# Altium footprint library 元件2.PcbLib: 204 footprints (part 1 of 13)
Each footprint in its own frame and in the unit in brackets; x right, y up, seen from the top. Pads: shape width x height; smd on the part's side, far side on the other; paste and mask are expansions set on the pad; w line width, h text height; cw(c..) or ccw(c..) is an arc to the next point about the centre after c.
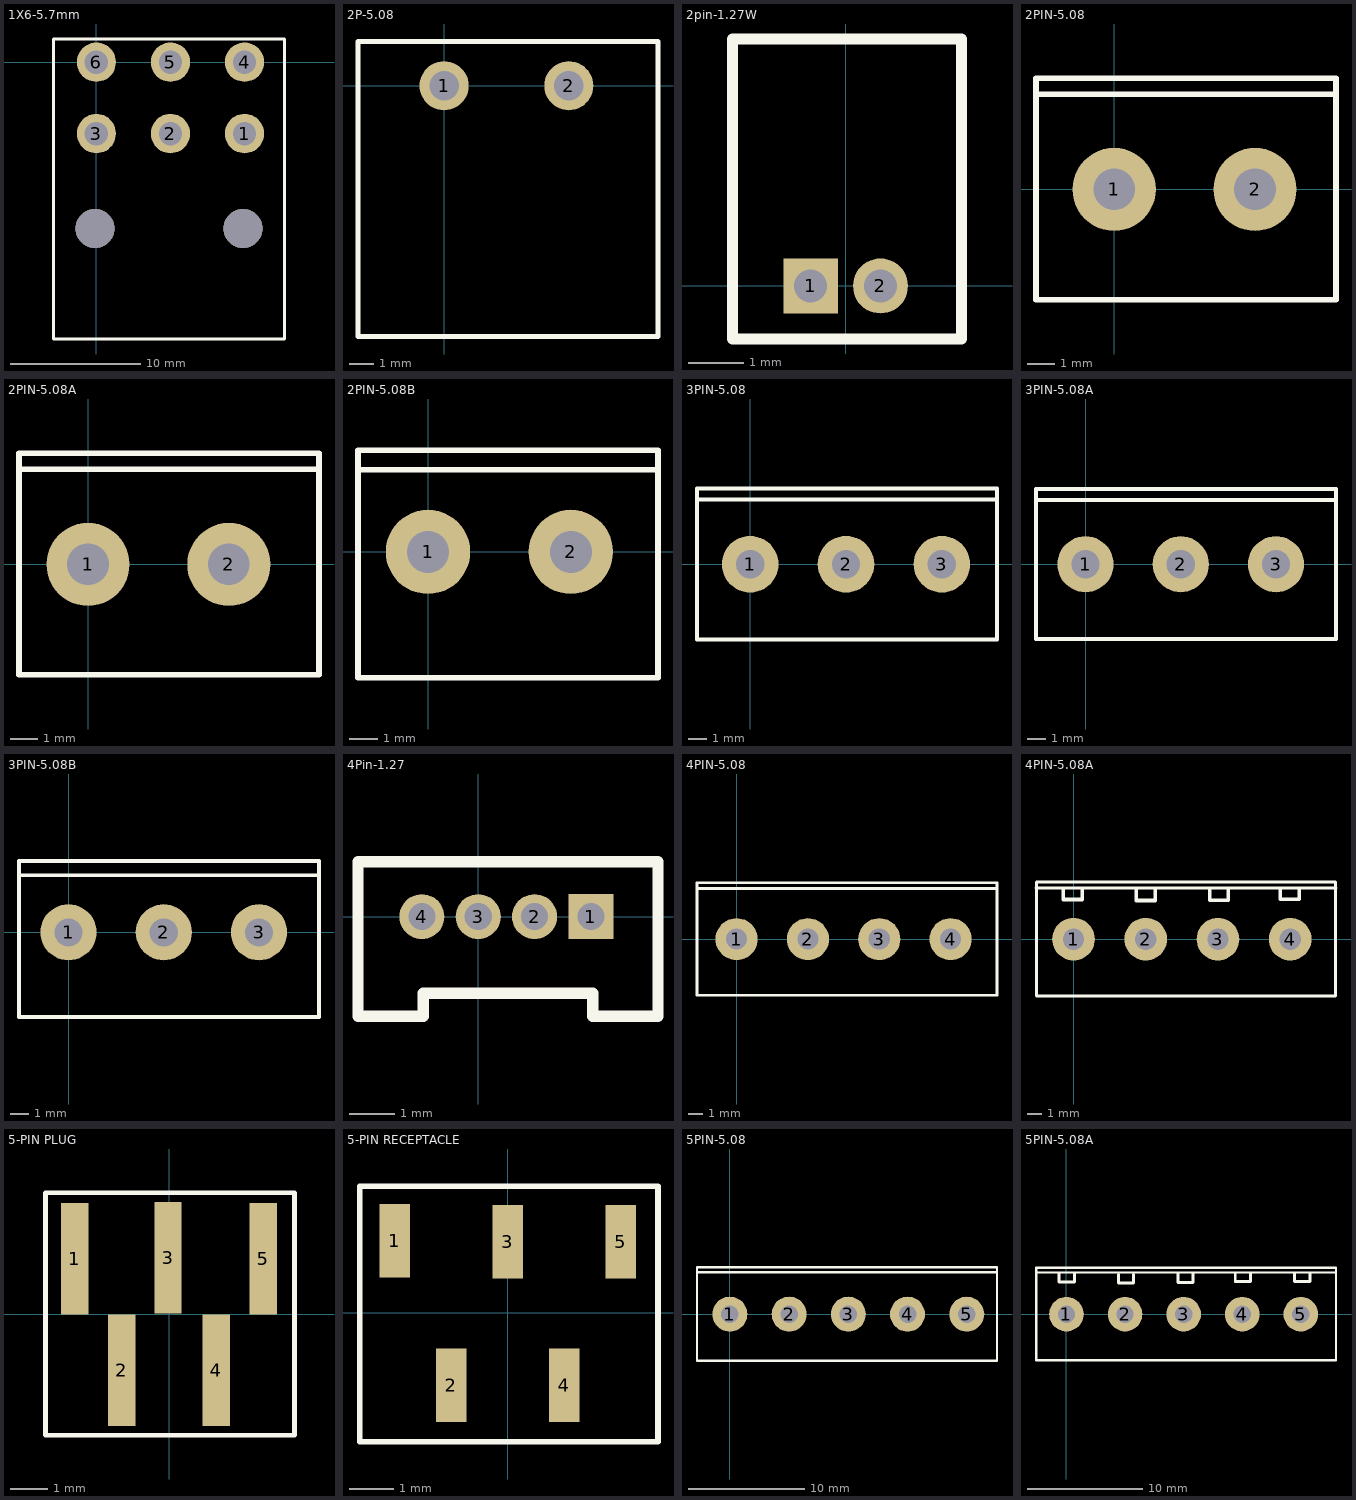
[diagram p0: the footprints below, top view; thin cyan lines are the x and y axes]

## 1X6-5.7mm [mm] "1X06"
pads (6):
  oval 3x3.048 hole 1.8: 1(11.4,-5.5) 2(5.7,-5.5) 3(0,-5.5) 4(11.4,0) 5(5.7,0) 6(0,0)
via 11.298,-12.8 diameter 3 hole 3
via -0.102,-12.802 diameter 3 hole 3
Top Overlay:
  lines w0.254: -3.302,-21.311 -3.302,1.778 14.478,1.778 14.478,-21.311 -3.302,-21.311
3D body "1720640006.stp": height 14.62, standoff -3.52, extent -3.226,-21.242 14.534,0.719

## 2P-5.08 [mm]
height 0.9
pads (2):
  round 2 hole 1.2: 1(0,0) 2(5.08,0)
Top Overlay:
  lines w0.2: -3.505,-10.211 8.712,-10.211 8.712,1.803 -3.505,1.803 -3.505,-10.211
3D body "14043.stp": height 8.6, standoff -3.5, extent -3.464,-10.109 8.696,1.893

## 2pin-1.27W [mm] "Molex PicoBlade 2-way housing, positive"
pads (2):
  rect 1x1 hole 0.6: 1(-0.635,0)
  round 1 hole 0.6: 2(0.635,0)
Top Overlay:
  lines w0.2: -2.057,-0.965 2.108,-0.965 2.108,4.496 -2.057,4.496 -2.057,-0.965
3D body "User Library-53048-0210.STEP": height 3.5, standoff -2.4, extent -2.108,-0.997 2.142,4.503

## 2PIN-5.08 [mm]
pads (2):
  round 3 hole 1.5: 1(0,0) 2(5.08,0)
Top Overlay:
  lines w0.2: -2.819,3.429 8.001,3.429 ; -2.819,-3.988 8.001,-3.988 8.001,4.013 -2.819,4.013 -2.819,-3.988
3D body "3970.stp": height 14.99, standoff -4.01, extent -1.525,-3.175 6.555,3.175

## 2PIN-5.08A [mm]
pads (2):
  round 3 hole 1.5: 1(0,0) 2(5.08,0)
Top Overlay:
  lines w0.2: -2.489,3.429 8.255,3.429 ; -2.489,-3.988 -2.489,4.013 8.331,4.013 8.331,-3.988 -2.489,-3.988
3D body "2-5.08 (2).stp": height 14.2, standoff -3.5, extent -2.54,-5.205 8.361,4.595

## 2PIN-5.08B [mm] "3A"
pads (2):
  round 3 hole 1.5: 1(0,0) 2(5.08,0)
Top Overlay:
  lines w0.2: -2.438,2.921 8.119,2.921 ; -2.489,-4.47 8.179,-4.47 8.179,3.607 -2.489,3.607 -2.489,-4.47
3D body "3A-2way.step": height 10, standoff -3, extent -2.481,-4.577 8.119,3.023

## 3PIN-5.08 [mm]
pads (3):
  round 3 hole 1.5: 1(0,0) 2(5.08,0) 3(10.16,0)
Top Overlay:
  lines w0.2: -2.819,3.429 13.081,3.429 ; -2.819,-3.988 -2.819,4.013 13.081,4.013 13.081,-3.988 -2.819,-3.988
3D body "3971.stp": height 14.99, standoff -4.01, extent -1.5,-3.15 11.66,3.2

## 3PIN-5.08A [mm] "3A"
pads (3):
  round 3 hole 1.5: 1(0,0) 2(5.08,0) 3(10.16,0)
Top Overlay:
  lines w0.2: -2.642,3.429 13.284,3.429 ; -2.642,-3.988 13.36,-3.988 13.36,4.013 -2.642,4.013 -2.642,-3.988
3D body "3-5.08.stp": height 14.2, standoff -3.5, extent -2.53,-5.207 13.452,4.593

## 3PIN-5.08B [mm]
pads (3):
  round 3 hole 1.5: 1(0,0) 2(5.08,0) 3(10.16,0)
Top Overlay:
  lines w0.2: -2.616,3.048 13.31,3.048 ; -2.642,-4.521 -2.642,3.81 13.36,3.81 13.36,-4.521 -2.642,-4.521
3D body "User Library-Terminal-Screw-3A-3way.step": height 10, standoff -3, extent -2.466,-4.623 13.134,2.977

## 4Pin-1.27 [mm]
pads (4):
  rect 1x1 hole 0.6: 1(2.5,0)
  round 1 hole 0.6: 2(1.25,0) 3(0,0) 4(-1.25,0)
Top Overlay:
  lines w0.254: -2.667,-2.21 -2.667,1.219 3.988,1.219 3.988,-2.21 2.54,-2.21 2.54,-1.702 -0.495,-1.702 -1.219,-1.702 -1.219,-2.21 -2.667,-2.21
3D body "31732.stp": height 4.37, standoff -2.23, extent -2.69,-2.206 3.96,1.194

## 4PIN-5.08 [mm]
pads (4):
  round 3 hole 1.5: 1(0,0) 2(5.08,0) 3(10.16,0) 4(15.24,0)
Top Overlay:
  lines w0.2: -2.819,3.607 18.542,3.607 ; -2.819,-3.988 18.542,-3.988 18.542,4.013 -2.819,4.013 -2.819,-3.988
3D body "3972.stp": height 14.99, standoff -4.01, extent -1.525,-3.2 16.715,3.149

## 4PIN-5.08A [mm]
pads (4):
  round 3 hole 1.5: 1(0,0) 2(5.08,0) 3(10.16,0) 4(15.24,0)
Top Overlay:
  lines w0.2: -2.642,3.607 18.466,3.607 ; -2.616,-3.988 -2.616,4.013 18.44,4.013 18.44,-3.988 -2.616,-3.988
  lines w0.254: -0.711,3.531 -0.711,2.794 0.61,2.794 0.61,3.531 ; 4.42,3.454 4.42,2.718 5.74,2.718 5.74,3.454 ; 9.576,3.48 9.576,2.743 10.897,2.743 10.897,3.48 ; 14.554,3.556 14.554,2.819 15.875,2.819 15.875,3.556
3D body "4-5.08.stp": height 10, standoff -3.5, extent -2.54,-4.039 18.35,4.061

## 5-PIN PLUG [mil] "5 PIN PLUG SMT"
pads (5):
  rect 29x118 smd: 1(-100,59) 2(-50,-59) 3(-1,60) 4(50,-59) 5(100,59)
Top Overlay:
  lines w5: -131,-128 -131,129 133,129 133,-128 -131,-128
3D body "5_pin_plug_SMT.stp": height 244.09, standoff -5.91, extent -134.65,-99.61 131.5,82.68

## 5-PIN RECEPTACLE [mm] "5 PIN RECEPTACLE SMT"
pads (5):
  rect 0.68x1.65 smd: 1(-2.54,1.625) 2(-1.27,-1.625) 3(0,1.6) 4(1.27,-1.625) 5(2.54,1.6)
Top Overlay:
  lines w0.127: -3.327,-2.896 3.378,-2.896 3.378,2.845 -3.327,2.845 -3.327,-2.896
3D body "5_pin_header_SMT.stp": height 6.3, standoff 0, extent -3.35,-2.2 3.45,2

## 5PIN-5.08 [mm]
pads (5):
  round 3 hole 1.5: 1(0,0) 2(5.08,0) 3(10.16,0) 4(15.24,0) 5(20.32,0)
Top Overlay:
  lines w0.2: -2.819,3.607 22.911,3.607 ; -2.819,-3.988 22.911,-3.988 22.911,4.013 -2.819,4.013 -2.819,-3.988
3D body "3973.stp": height 14.99, standoff -4.01, extent -1.473,-3.2 21.847,3.15

## 5PIN-5.08A [mm]
pads (5):
  round 3 hole 1.5: 1(0,0) 2(5.08,0) 3(10.16,0) 4(15.24,0) 5(20.32,0)
Top Overlay:
  lines w0.2: -2.642,3.607 23.368,3.607 ; -2.616,-3.988 23.368,-3.988 23.368,4.013 -2.616,4.013 -2.616,-3.988
  lines w0.254: -0.635,3.531 -0.635,2.794 0.686,2.794 0.686,3.531 ; 4.496,3.454 4.496,2.718 5.817,2.718 5.817,3.454 ; 9.652,3.48 9.652,2.743 10.973,2.743 10.973,3.48 ; 14.63,3.556 14.63,2.819 15.951,2.819 15.951,3.556 ; 19.787,3.581 19.787,2.845 21.107,2.845 21.107,3.581
3D body "5-5.08.stp": height 10.2, standoff -3.3, extent -2.546,-3.96 23.424,4.14